# Altium footprint library CMR_Miscellaneous_Devices.PcbLib: 103 footprints (part 2 of 7)
Each footprint in its own frame and in the unit in brackets; x right, y up, seen from the top. Pads: shape width x height; smd on the part's side, far side on the other; paste and mask are expansions set on the pad; w line width, h text height; cw(c..) or ccw(c..) is an arc to the next point about the centre after c.
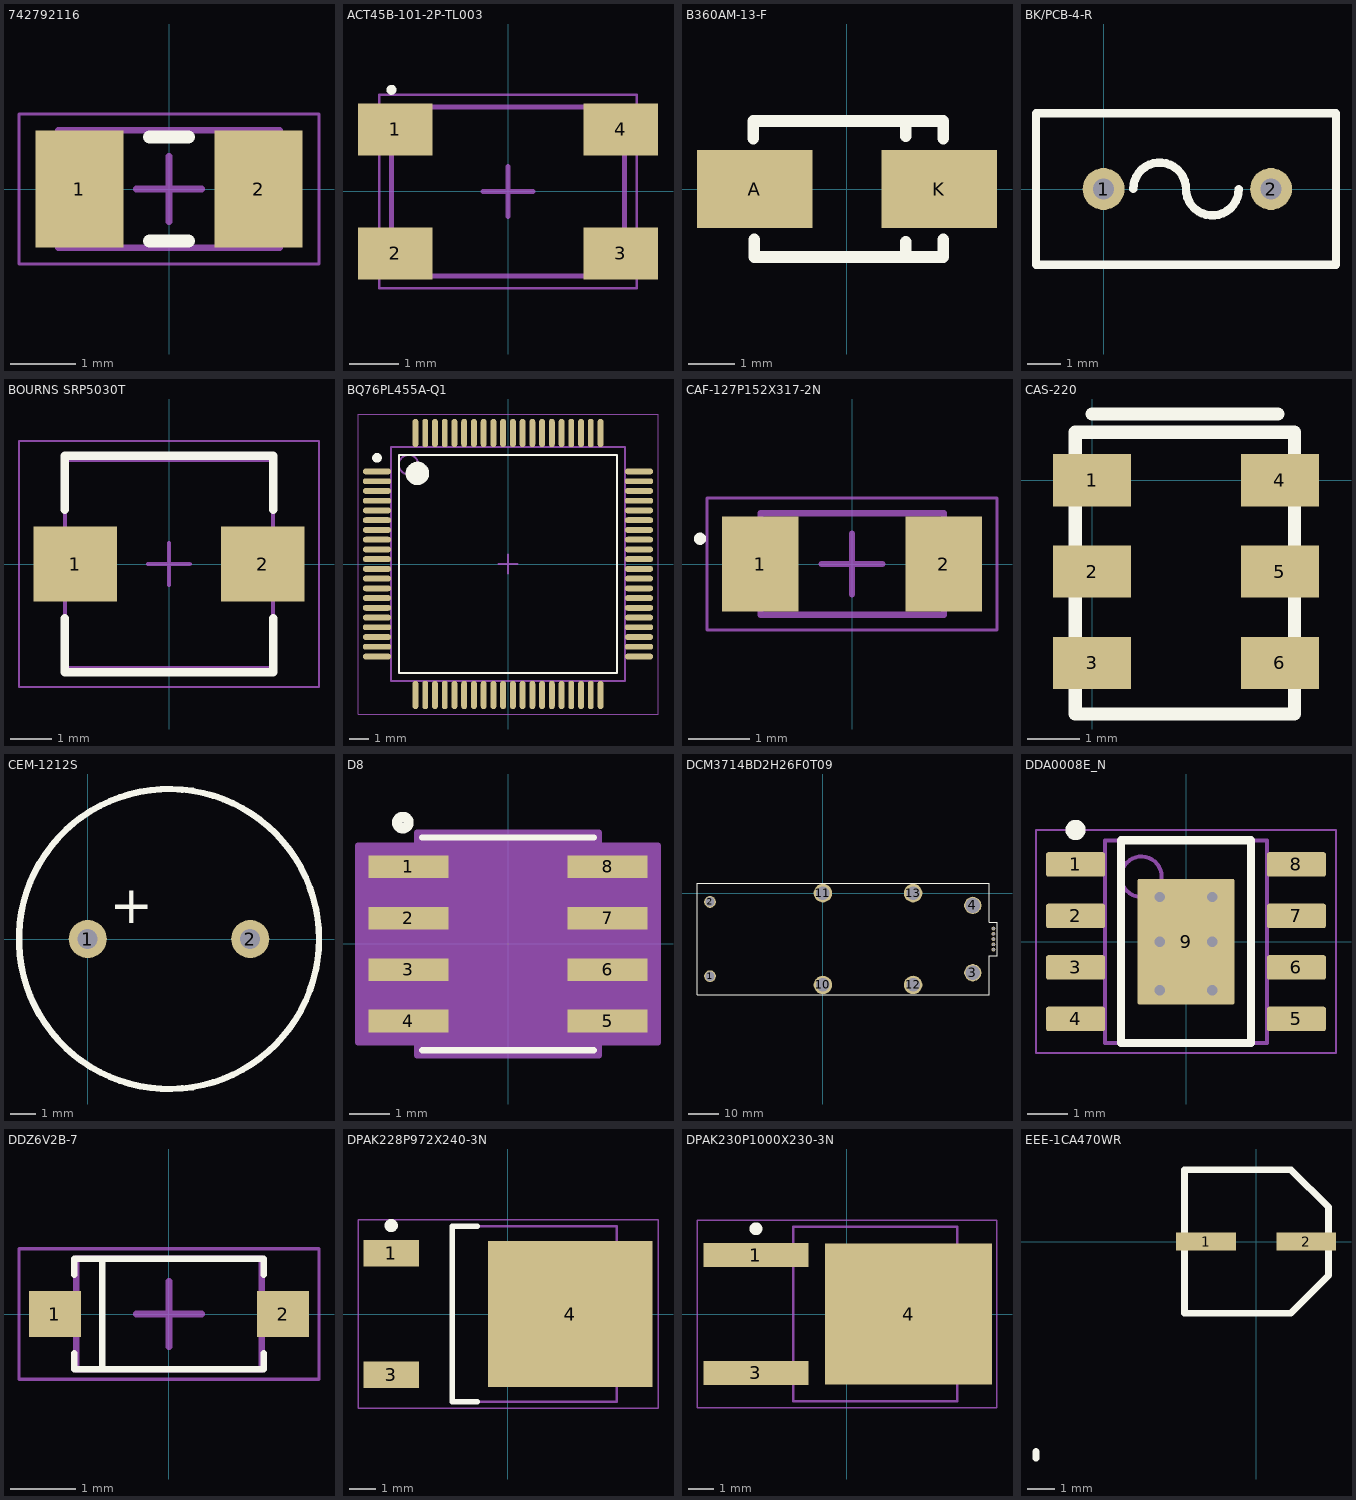
[diagram p1: the footprints below, top view; thin cyan lines are the x and y axes]

## 742792116 [mm] ", 2-Leads, Body 3.20x1.60mm, IPC Medium Density"
height 1.3
pads (2):
  rect 1.35x1.8 smd: 1(-1.375,0) 2(1.375,0)
Top Overlay:
  lines w0.2: -0.3,-0.8 0.3,-0.8 ; -0.3,0.8 0.3,0.8
Mechanical 13:
  lines w0.1: -1.7,-0.9 1.7,-0.9 1.7,0.9 -1.7,0.9 -1.7,-0.9
Mechanical 15:
  lines w0.05: -2.3,-1.15 2.3,-1.15 2.3,1.15 -2.3,1.15 -2.3,-1.15
  lines w0.1: -0.5,0 0.5,0 ; 0,-0.5 0,0.5
3D body "STEP-WE-CBF-1206-rev1.stp": height 1.05, standoff -0.05, extent -1.6,-0.8 1.6,0.8

## ACT45B-101-2P-TL003 [mm] "DFN, 4-Leads, Body 3.20x4.50mm, Pitch 4.55mm, IPC Medium Density"
height 3
pads (4):
  rect 1.5x1.05 smd: 1(-2.275,1.25) 2(-2.275,-1.25) 3(2.275,-1.25) 4(2.275,1.25)
Top Overlay:
  circle w0.1: c-2.35,2.05 r0.05
Mechanical 13:
  lines w0.1: -2.35,-1.7 -2.35,1.7 2.35,1.7 2.35,-1.7 -2.35,-1.7
Mechanical 15:
  lines w0.05: -2.6,-1.95 -2.6,1.95 2.6,1.95 2.6,-1.95 -2.6,-1.95
  lines w0.1: -0.5,0 0.5,0 ; 0,-0.5 0,0.5
3D body "act45b.step": height 2.8, standoff 0, extent -2.223,-1.622 2.277,1.578

## B360AM-13-F [mm]
pads (2):
  rect 2.5x1.7 smd: A(-2,0) K(2,0)
Top Overlay:
  lines w0.254: -2.032,1.092 -2.032,1.473 2.083,1.473 2.083,1.092 ; -2.007,-1.094 -2.007,-1.473 2.083,-1.473 2.083,-1.092 ; 1.27,-1.473 1.27,-1.143 ; 1.27,1.143 1.27,1.397
3D body "Diode SMA.stp": height 2.41, standoff 0, extent -2.615,-1.473 2.665,1.447

## BK/PCB-4-R [mm]
pads (2):
  round 1.27 hole 0.635: 1(0,0) 2(5.08,0)
Top Overlay:
  lines w0.254: 0.9,0 cw(c1.7,0) 2.5,0 ccw(c3.3,0) 4.1,0 ; 7.05,-2.3 7.05,2.3 -2.05,2.3 -2.05,-2.3 7.05,-2.3 ; 7.05,-2.3 7.05,-2.3
3D body: height 8.76, standoff 0, extent -2.05,-2.3 7.05,2.3

## BOURNS SRP5030T [mm] "Precision Wire Wound Inductor, 2-Leads, Body 5.70x5.20mm, IPC Medium Density"
height 3
pads (2):
  rect 2x1.8 smd: 1(-2.25,0) 2(2.25,0)
Top Overlay:
  lines w0.2: -2.5,-1.3 -2.5,-2.6 2.5,-2.6 2.5,-1.3 ; -2.5,1.3 -2.5,2.6 2.5,2.6 2.5,1.3
Mechanical 13:
  lines w0.1: -2.5,-2.5 2.5,-2.5 2.5,2.5 -2.5,2.5 -2.5,-2.5
Mechanical 15:
  lines w0.05: -3.6,-2.95 3.6,-2.95 3.6,2.95 -3.6,2.95 -3.6,-2.95
  lines w0.1: -0.5,0 0.5,0 ; 0,-0.5 0,0.5
3D body "Bourns SRP5030T.STEP": height 3, standoff 0, extent -2.85,-2.6 2.85,2.6

## BQ76PL455A-Q1 [mm] "TSQFP, 80-Leads, Body 12.00x12.00mm, Pitch 0.50mm, IPC Medium Density"
height 1.2
pads (80):
  oval 1.45x0.3 smd: 1(-6.725,4.75) 2(-6.725,4.25) 3(-6.725,3.75) 4(-6.725,3.25) 5(-6.725,2.75) 6(-6.725,2.25) 7(-6.725,1.75) 8(-6.725,1.25) 9(-6.725,0.75) 10(-6.725,0.25) 11(-6.725,-0.25) 12(-6.725,-0.75) 13(-6.725,-1.25) 14(-6.725,-1.75) 15(-6.725,-2.25) 16(-6.725,-2.75) 17(-6.725,-3.25) 18(-6.725,-3.75) 19(-6.725,-4.25) 20(-6.725,-4.75) 41(6.725,-4.75) 42(6.725,-4.25) 43(6.725,-3.75) 44(6.725,-3.25) 45(6.725,-2.75) 46(6.725,-2.25) 47(6.725,-1.75) 48(6.725,-1.25) 49(6.725,-0.75) 50(6.725,-0.25) 51(6.725,0.25) 52(6.725,0.75) 53(6.725,1.25) 54(6.725,1.75) 55(6.725,2.25) 56(6.725,2.75) 57(6.725,3.25) 58(6.725,3.75) 59(6.725,4.25) 60(6.725,4.75)
  oval 0.3x1.45 smd: 21(-4.75,-6.725) 22(-4.25,-6.725) 23(-3.75,-6.725) 24(-3.25,-6.725) 25(-2.75,-6.725) 26(-2.25,-6.725) 27(-1.75,-6.725) 28(-1.25,-6.725) 29(-0.75,-6.725) 30(-0.25,-6.725) 31(0.25,-6.725) 32(0.75,-6.725) 33(1.25,-6.725) 34(1.75,-6.725) 35(2.25,-6.725) 36(2.75,-6.725) 37(3.25,-6.725) 38(3.75,-6.725) 39(4.25,-6.725) 40(4.75,-6.725) 61(4.75,6.725) 62(4.25,6.725) 63(3.75,6.725) 64(3.25,6.725) 65(2.75,6.725) 66(2.25,6.725) 67(1.75,6.725) 68(1.25,6.725) 69(0.75,6.725) 70(0.25,6.725) 71(-0.25,6.725) 72(-0.75,6.725) 73(-1.25,6.725) 74(-1.75,6.725) 75(-2.25,6.725) 76(-2.75,6.725) 77(-3.25,6.725) 78(-3.75,6.725) 79(-4.25,6.725) 80(-4.75,6.725)
Top Overlay:
  circle w0.6: c-4.65,4.65 r0.3
  circle w0.25: c-6.725,5.45 r0.125
  lines w0.1: -5.6,-5.6 5.6,-5.6 5.6,5.6 -5.6,5.6 -5.6,-5.6
Mechanical 13:
  circle w0.1: c-5.1,5.1 r0.5
  lines w0.1: -6,-6 6,-6 6,6 -6,6 -6,-6
Mechanical 15:
  lines w0.05: -7.7,-7.7 7.7,-7.7 7.7,7.7 -7.7,7.7 -7.7,-7.7
  lines w0.1: -0.5,0 0.5,0 ; 0,-0.5 0,0.5
3D body "TSQFP50P1400X1400X120-80N.step": height 1.2, standoff 0, extent -7,-7 7,7

## CAF-127P152X317-2N [mm] "Chip Array, Flat, 2-Leads, Pitch 1.27mm,  Body 1.52x3.18mm,  IPC Medium Density"
height 0.66
pads (2):
  rect 1.25x1.55 smd: 1(-1.5,0) 2(1.5,0)
Top Overlay:
  circle w0.1: c-2.487,0.413 r0.05
Mechanical 13:
  lines w0.1: -1.5,-0.83 -1.5,0.83 1.5,0.83 1.5,-0.83 -1.5,-0.83
Mechanical 15:
  lines w0.05: -2.37,-1.08 -2.37,1.08 2.37,1.08 2.37,-1.08 -2.37,-1.08
  lines w0.1: -0.5,0 0.5,0 ; 0,-0.5 0,0.5
3D body "CAF-127P152X317-2N.step": height 0.66, standoff 0, extent -1.705,-0.83 1.705,0.83

## CAS-220 [mm]
pads (6):
  rect 1.5x1 smd: 1(0,0) 2(0,-1.75) 3(0,-3.5) 4(3.6,0) 5(3.6,-1.75) 6(3.6,-3.5)
Top Overlay:
  lines w0.254: 0,1.27 3.556,1.27 ; -0.322,-4.478 -0.322,0.922 3.878,0.922 3.878,-4.478 -0.322,-4.478
3D body: height 2.5, standoff 0.1, extent -0.322,-4.478 3.878,0.922

## CEM-1212S [mil]
pads (2):
  round 60 hole 31.5: 1(0,0) 2(255.91,0)
Top Overlay:
  circle w10: c127.95,0 r236.22
  text "+" at 35,25 h60
3D body "Buzzer.STEP": height 374.02, standoff -76.54, extent -108.22,-236.22 364.22,236.22

## D8 [mil]
pads (8):
  rect 78x22 smd paste+0: 1(-97,75) 2(-97,25) 3(-97,-25) 4(-97,-75) 5(97,-75) 6(97,-25) 7(97,25) 8(97,75)
Top Overlay:
  circle w10: c-102.36,118.11 r5.57
  lines w6: -83.5,-103.5 83.5,-103.5 ; -83.5,103.5 83.5,103.5
Mechanical 13:
  lines w0: -12,98.5 ccw(c0,98.5) 12,98.5
  lines w1: -122,-85 -78.5,-85 -78.5,-65 -122,-65 -122,-85 ; -122,-35 -78.5,-35 -78.5,-15 -122,-15 -122,-35 ; -122,15 -78.5,15 -78.5,35 -122,35 -122,15 ; -122,65 -78.5,65 -78.5,85 -122,85 -122,65 ; -78.5,-98.5 -78.5,98.5 78.5,98.5 78.5,-98.5 -78.5,-98.5 ; 78.5,-85 122,-85 122,-65 78.5,-65 78.5,-85 ; 78.5,-35 122,-35 122,-15 78.5,-15 78.5,-35 ; 78.5,15 122,15 122,35 78.5,35 78.5,15 ; 78.5,65 122,65 122,85 78.5,85 78.5,65
  text "*" at -76,45.5 h50
Mechanical 15:
  region: -88.5,-96 -146,-96 -146,96 -88.5,96 -88.5,108.5 88.5,108.5 88.5,96 146,96 146,-96 88.5,-96 88.5,-108.5 -88.5,-108.5
  lines w6: -146,-96 -88.5,-96 -88.5,-108.5 88.5,-108.5 88.5,-96 146,-96 146,96 88.5,96 88.5,108.5 -88.5,108.5 -88.5,96 -146,96 -146,-96
3D body: height 9.84, standoff 0, extent 70,65 125,85
3D body: height 9.84, standoff 0, extent 70,15 125,35
3D body: height 9.84, standoff 0, extent 70,-35 125,-15
3D body: height 9.84, standoff 0, extent 70,-85 125,-65
3D body: height 9.84, standoff 0, extent -125,-85 -70,-65
3D body: height 9.84, standoff 0, extent -125,-35 -70,-15
3D body: height 9.84, standoff 0, extent -125,15 -70,35
3D body: height 9.84, standoff 0, extent -125,65 -70,85
3D body: height 68.9, standoff 7.87, extent -78.5,-98.5 78.5,98.5

## DCM3714BD2H26F0T09 [mil]
pads (13):
  round 150 hole 120: 1(-1439,-1059) 2(-1439,-112)
  round 220 hole 190: 3(1911,-1015) 4(1911,-156)
  round 48 hole 40: 5(2174,-720) 6(2174,-653) 7(2174,-586) 8(2174,-519) 9(2174,-452)
  round 236 hole 172: 10(0,-1171) 11(0,0) 12(1150,-1171) 13(1150,0)
Top Overlay:
  lines w10: -1605.14,123 -1605.14,-1293.06 2120,-1293.06 2120,-800 2220,-800 2220,-370 2120,-370 2120,123.61 -1605.14,123.61
3D body "VIA_3714_longpin.stp": height 364.77, standoff -210.87, extent -1605.14,-1285.6 2226.94,113.61

## DDA0008E_N [mm] "SOP, 8-Leads, Body 4x5mm, Pitch 1.27mm, Thermal Pad 2.4x3.1mm, IPC Medium Density"
height 1.7
pads (9):
  rrect17% 1.45x0.6 smd: 1(-2.725,1.905) 2(-2.725,0.635) 3(-2.725,-0.635) 4(-2.725,-1.905) 5(2.725,-1.905) 6(2.725,-0.635) 7(2.725,0.635) 8(2.725,1.905)
  rrect4% 2.4x3.1 smd: 9(0,0)
via -0.65,-1.2 diameter 0.508 hole 0.254
via 0.65,1.1 diameter 0.508 hole 0.254
via -0.65,1.1 diameter 0.508 hole 0.254
via -0.65,0 diameter 0.508 hole 0.254
via 0.65,-1.2 diameter 0.508 hole 0.254
via 0.65,0 diameter 0.508 hole 0.254
Top Overlay:
  circle w0.25: c-2.725,2.755 r0.125
  lines w0.2: -1.6,-2.5 -1.6,2.5 1.6,2.5 1.6,-2.5 -1.6,-2.5
Mechanical 1:
  text ".Designator" at -1.524,-0.254 h0.8
Mechanical 13:
  circle w0.1: c-1.1,1.6 r0.5
  lines w0.1: -2,-2.5 -2,2.5 2,2.5 2,-2.5 -2,-2.5
Mechanical 15:
  lines w0.05: -3.7,-2.75 -3.7,2.75 3.7,2.75 3.7,-2.75 -3.7,-2.75
  lines w0.1: -0.5,0 0.5,0 ; 0,-0.5 0,0.5
3D body "MRA08A.stp": height 1.5, standoff -0.05, extent -2.978,-2.451 2.978,2.451

## DDZ6V2B-7 [mm]
height 1.35
pads (2):
  rect 0.8x0.7 smd: 1(-1.75,0) 2(1.75,0)
Top Overlay:
  lines w0.1: -1.45,-0.6 -1.45,-0.85 1.45,-0.85 1.45,-0.6 ; -1.45,0.6 -1.45,0.85 1.45,0.85 1.45,0.6 ; -1.025,-0.85 -1.025,0.85
Mechanical 13:
  lines w0.1: -1.425,-0.85 1.425,-0.85 1.425,0.85 -1.425,0.85 -1.425,-0.85
Mechanical 15:
  lines w0.05: -2.3,-1 2.3,-1 2.3,1 -2.3,1 -2.3,-1
  lines w0.1: -0.5,0 0.5,0 ; 0,-0.5 0,0.5
3D body "DDZ6V2B-7.step": height 1.35, standoff 0, extent -1.85,-0.85 1.85,0.85

## DPAK228P972X240-3N [mm] "D-PAK, 3-Pads, Body 6.20x6.66mm (max), IPC Medium Density"
height 2.4
pads (3):
  rect 2.1x1 smd: 1(-4.4,2.28) 3(-4.4,-2.28)
  rect 6.2x5.5 smd: 4(2.35,0)
Top Overlay:
  circle w0.25: c-4.4,3.33 r0.125
  lines w0.2: -1.15,-3.3 -2.1,-3.3 -2.1,3.3 -1.15,3.3
Mechanical 13:
  lines w0.1: -2.1,-3.3 -2.1,3.3 4.1,3.3 4.1,-3.3 -2.1,-3.3
Mechanical 15:
  lines w0.05: -5.65,-3.55 -5.65,3.55 5.65,3.55 5.65,-3.55 -5.65,-3.55
  lines w0.1: -0.5,0 0.5,0 ; 0,-0.5 0,0.5
3D body "DPAK228P972X240-3N.step": height 3.5, standoff 0, extent -4.225,-3.3 5.5,3.3

## DPAK230P1000X230-3N [mm] "D-PAK, 3-Pads, Body 6.30x6.76mm (max), IPC Medium Density"
height 2.3
pads (3):
  rect 4.1x0.95 smd: 1(-3.55,2.3) 3(-3.55,-2.3)
  rect 6.5x5.5 smd: 4(2.4,0)
Top Overlay:
  circle w0.25: c-3.55,3.325 r0.125
Mechanical 13:
  lines w0.1: -2.1,-3.4 4.3,-3.4 4.3,3.4 -2.1,3.4 -2.1,-3.4
Mechanical 15:
  lines w0.05: -5.85,-3.65 5.85,-3.65 5.85,3.65 -5.85,3.65 -5.85,-3.65
  lines w0.1: -0.5,0 0.5,0 ; 0,-0.5 0,0.5
3D body "DPAK230P1000X230-3N.step": height 2.3, standoff 0, extent -4.4,-3.4 5.6,3.4

## EEE-1CA470WR [mm]
height 5.4
pads (2):
  rect 2.2x0.65 smd: 1(-1.85,0) 2(1.85,0)
Top Overlay:
  lines w0.254: -8.128,-8.001 -8.128,-7.747 ; 2.65,-1.27 1.27,-2.65 -2.65,-2.65 -2.65,2.65 1.287,2.65 2.667,1.27 2.667,-1.253
3D body: height 5.4, standoff 0, extent -2.5,-2.497 2.5,2.497
3D body: height 0.25, standoff 0, extent 0,0 0,0